# Altium footprint library My Library.PCBLIB: 198 footprints (part 13 of 13)
Each footprint in its own frame and in the unit in brackets; x right, y up, seen from the top. Pads: shape width x height; smd on the part's side, far side on the other; paste and mask are expansions set on the pad; w line width, h text height; cw(c..) or ccw(c..) is an arc to the next point about the centre after c.
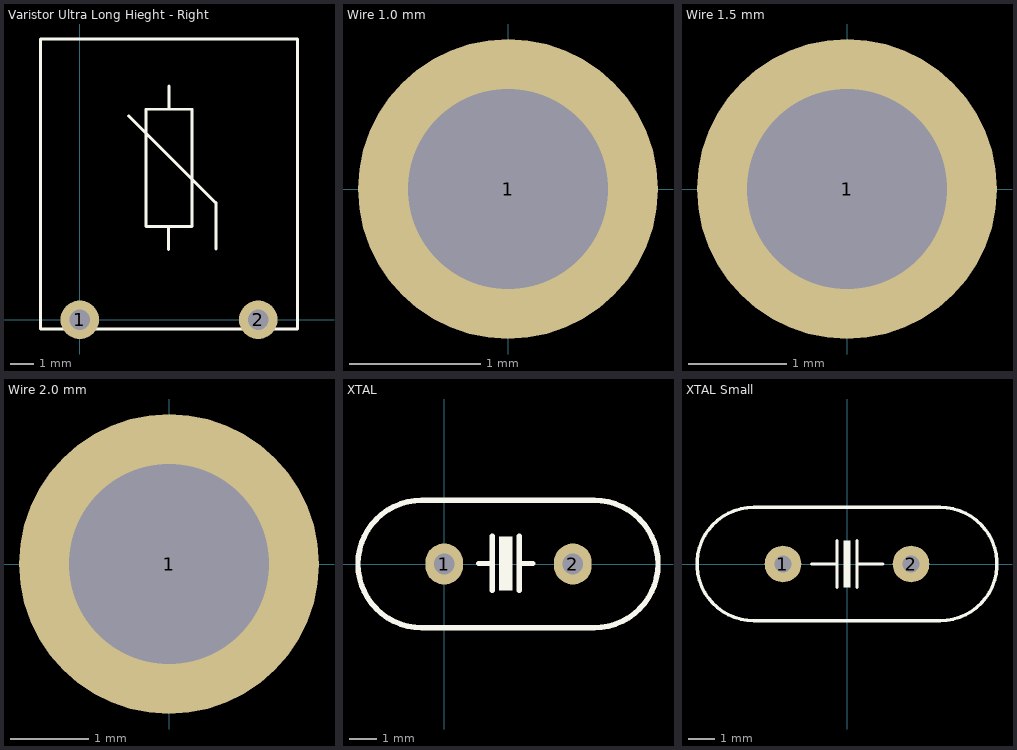
[diagram p12: the footprints below, top view; thin cyan lines are the x and y axes]

## Varistor Ultra Long Hieght - Right [mil] "JVR10N331k With Medium Hieght Legs and Right Angle"
pads (2):
  round 65 hole 35: 1(0,0) 2(300,0)
Top Overlay:
  lines w5: 82,343 228,197 229,197 229,119 ; 149,118 149,157 ; 150,354 150,393 ; -66.54,-16 366.54,-16 366.54,472.19 -66.54,472.19 -66.54,-16 ; 111,157 189,157 189,354 111,354 111,157
3D body "JVR10N331k_untra long_2009.STEP": height 664.15, standoff -98.43, extent -66.54,-16 366.54,472.19

## Wire 1.0 mm [mil]
pads (1):
  round 90 hole 60: 1(0,0)
3D body: height 204.72, standoff 7.87, extent -35.15,-35.36 35.44,35.37
3D body: height 118.11, standoff -78.74, extent -19.53,-19.64 19.69,19.65

## Wire 1.5 mm [mil]
pads (1):
  round 120 hole 80: 1(0,0)
3D body: height 204.72, standoff 7.87, extent -42.96,-43.22 43.31,43.23
3D body: height 118.11, standoff -78.74, extent -29.29,-29.47 29.53,29.47

## Wire 2.0 mm [mil]
pads (1):
  round 150 hole 100: 1(0,0)
3D body: height 118.11, standoff -78.74, extent -39.06,-39.29 39.37,39.29
3D body: height 204.72, standoff 7.87, extent -58.59,-58.93 59.06,58.94

## XTAL [mil]
height 590.55
pads (2):
  oval 55x60 hole 30: 1(0,0) 2(187.4,0)
Top Overlay:
  rectangle: 79.53,-38.58 99.21,40.16
  lines w7.87: 50,0.79 69.69,0.79 ; 69.69,-38.58 69.69,40.16 ; 109.06,-38.58 109.06,40.16 ; 109.06,0.79 128.74,0.79 ; -32.68,-92.91 cw(c-32.68,0) -32.68,92.91 218.5,92.91 cw(c218.5,0) 218.5,-92.91 -32.68,-92.91
3D body "Part5.STEP": height 514.25, standoff -94.02, extent -130.71,-93.7 316.14,95.28

## XTAL Small [mil]
pads (2):
  round 55 hole 25: 1(-96.06,0) 2(96.06,0)
Top Overlay:
  rectangle: -5,-35 5,35
  lines w5: -53,0 -15,0 ; -15,-35 -15,35 ; 15,-35 15,35 ; 15,0 54,0 ; -140,-85 cw(c-140,0) -140,85 140,85 cw(c140,0) 140,-85 -140,-85
3D body "Crystal-3.8mm.STEP": height 140.16, standoff -78.74, extent -226.38,-88.58 226.38,88.58